# Altium footprint library Miscellaneous C_nn.PcbLib: 416 footprints (part 6 of 26)
Each footprint in its own frame and in the unit in brackets; x right, y up, seen from the top. Pads: shape width x height; smd on the part's side, far side on the other; paste and mask are expansions set on the pad; w line width, h text height; cw(c..) or ccw(c..) is an arc to the next point about the centre after c.
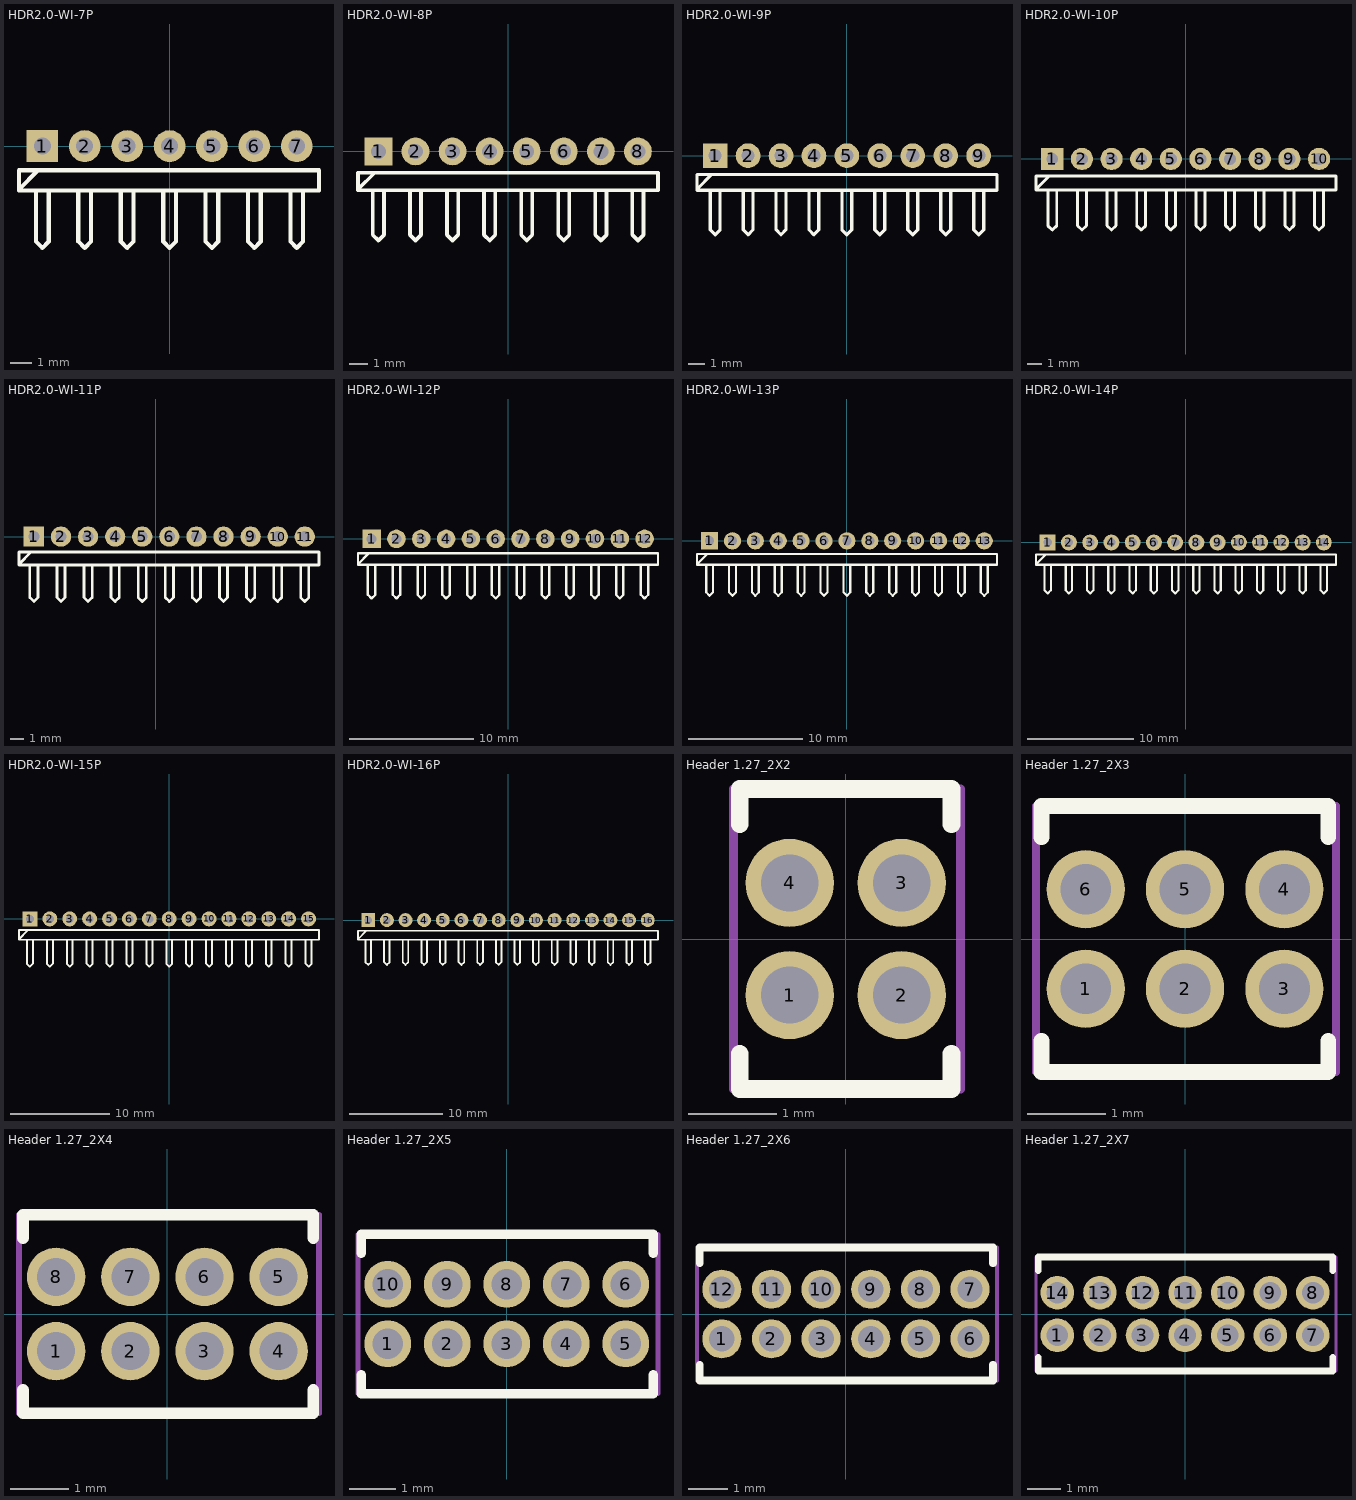
[diagram p5: the footprints below, top view; thin cyan lines are the x and y axes]

## HDR2.0-WI-7P [mm] "卧插，脚距：2.0mm"
pads (7):
  rect 1.5x1.5 hole 0.8: 1(-6,0)
  round 1.5 hole 0.8: 2(-4,0) 3(-2,0) 4(0,0) 5(2,0) 6(4,0) 7(6,0)
Top Overlay:
  lines w0.2: -7.1,-1.8 -7.1,-1.743 ; -6.3,-2.2 -6.3,-4.5 -6,-4.8 -5.7,-4.5 -5.7,-2.1 ; -6.2,-1.143 -7.1,-2.043 -7.1,-2.1 ; -4.3,-2.2 -4.3,-4.5 -4,-4.8 -3.7,-4.5 -3.7,-2.1 ; -2.3,-2.2 -2.3,-4.5 -2,-4.8 -1.7,-4.5 -1.7,-2.1 ; -0.3,-2.2 -0.3,-4.5 0,-4.8 0.3,-4.5 0.3,-2.1 ; 1.7,-2.2 1.7,-4.5 2,-4.8 2.3,-4.5 2.3,-2.1 ; 3.7,-2.2 3.7,-4.5 4,-4.8 4.3,-4.5 4.3,-2.1 ; 5.7,-2.2 5.7,-4.5 6,-4.8 6.3,-4.5 6.3,-2.1 ; -7.1,-2.1 -7.1,-1.143 -5.492,-1.143 7.049,-1.143 7.049,-2.1 -7.1,-2.1
3D body "HDR2.0-WI-7P.STEP": height 3.25, standoff -2.8, extent -7,-5 7,1

## HDR2.0-WI-8P [mm] "卧插，脚距：2.0mm"
pads (8):
  rect 1.5x1.5 hole 0.8: 1(-7,0)
  round 1.5 hole 0.8: 2(-5,0) 3(-3,0) 4(-1,0) 5(1,0) 6(3,0) 7(5,0) 8(7,0)
Top Overlay:
  lines w0.2: -8.1,-1.8 -8.1,-1.743 ; -7.3,-2.2 -7.3,-4.5 -7,-4.8 -6.7,-4.5 -6.7,-2.1 ; -7.2,-1.143 -8.1,-2.043 -8.1,-2.1 ; -5.3,-2.2 -5.3,-4.5 -5,-4.8 -4.7,-4.5 -4.7,-2.1 ; -3.3,-2.2 -3.3,-4.5 -3,-4.8 -2.7,-4.5 -2.7,-2.1 ; -1.3,-2.2 -1.3,-4.5 -1,-4.8 -0.7,-4.5 -0.7,-2.1 ; 0.7,-2.2 0.7,-4.5 1,-4.8 1.3,-4.5 1.3,-2.1 ; 2.7,-2.2 2.7,-4.5 3,-4.8 3.3,-4.5 3.3,-2.1 ; 4.7,-2.2 4.7,-4.5 5,-4.8 5.3,-4.5 5.3,-2.1 ; 6.7,-2.2 6.7,-4.5 7,-4.8 7.3,-4.5 7.3,-2.1 ; -8.1,-2.1 8.081,-2.1 8.081,-1.143 -6.492,-1.143 -8.1,-1.143 -8.1,-2.1
3D body "HDR2.0-WI-8P.STEP": height 3.25, standoff -2.8, extent -8,-5 8,1

## HDR2.0-WI-9P [mm] "卧插，脚距：2.0mm"
pads (9):
  rect 1.5x1.5 hole 0.8: 1(-8,0)
  round 1.5 hole 0.8: 2(-6,0) 3(-4,0) 4(-2,0) 5(0,0) 6(2,0) 7(4,0) 8(6,0) 9(8,0)
Top Overlay:
  lines w0.2: -9.1,-1.8 -9.1,-1.743 ; -8.3,-2.2 -8.3,-4.5 -8,-4.8 -7.7,-4.5 -7.7,-2.1 ; -8.2,-1.143 -9.1,-2.043 -9.1,-2.1 ; -6.3,-2.2 -6.3,-4.5 -6,-4.8 -5.7,-4.5 -5.7,-2.1 ; -4.3,-2.2 -4.3,-4.5 -4,-4.8 -3.7,-4.5 -3.7,-2.1 ; -2.3,-2.2 -2.3,-4.5 -2,-4.8 -1.7,-4.5 -1.7,-2.1 ; -0.3,-2.2 -0.3,-4.5 0,-4.8 0.3,-4.5 0.3,-2.1 ; 1.7,-2.2 1.7,-4.5 2,-4.8 2.3,-4.5 2.3,-2.1 ; 3.7,-2.2 3.7,-4.5 4,-4.8 4.3,-4.5 4.3,-2.1 ; 5.7,-2.2 5.7,-4.5 6,-4.8 6.3,-4.5 6.3,-2.1 ; 7.7,-2.2 7.7,-4.5 8,-4.8 8.3,-4.5 8.3,-2.1 ; -9.1,-2.1 -9.1,-1.143 -7.492,-1.143 9.113,-1.143 9.113,-2.1 -9.1,-2.1
3D body "HDR2.0-WI-9P.STEP": height 3.25, standoff -2.8, extent -9,-5 9,1

## HDR2.0-WI-10P [mm] "卧插，脚距：2.0mm"
pads (10):
  rect 1.5x1.5 hole 0.8: 1(-9,0)
  round 1.5 hole 0.8: 2(-7,0) 3(-5,0) 4(-3,0) 5(-1,0) 6(1,0) 7(3,0) 8(5,0) 9(7,0) 10(9,0)
Top Overlay:
  lines w0.2: -10.1,-1.8 -10.1,-1.743 ; -9.3,-2.2 -9.3,-4.5 -9,-4.8 -8.7,-4.5 -8.7,-2.1 ; -9.2,-1.143 -10.1,-2.043 -10.1,-2.1 ; -7.3,-2.2 -7.3,-4.5 -7,-4.8 -6.7,-4.5 -6.7,-2.1 ; -5.3,-2.2 -5.3,-4.5 -5,-4.8 -4.7,-4.5 -4.7,-2.1 ; -3.3,-2.2 -3.3,-4.5 -3,-4.8 -2.7,-4.5 -2.7,-2.1 ; -1.3,-2.2 -1.3,-4.5 -1,-4.8 -0.7,-4.5 -0.7,-2.1 ; 0.7,-2.2 0.7,-4.5 1,-4.8 1.3,-4.5 1.3,-2.1 ; 2.7,-2.2 2.7,-4.5 3,-4.8 3.3,-4.5 3.3,-2.1 ; 4.7,-2.2 4.7,-4.5 5,-4.8 5.3,-4.5 5.3,-2.1 ; 6.7,-2.2 6.7,-4.5 7,-4.8 7.3,-4.5 7.3,-2.1 ; 8.7,-2.2 8.7,-4.5 9,-4.8 9.3,-4.5 9.3,-2.1 ; -10.1,-2.1 10.145,-2.1 10.145,-1.143 -8.492,-1.143 -10.1,-1.143 -10.1,-2.1
3D body "HDR2.0-WI-10P.STEP": height 3.25, standoff -2.8, extent -10,-5 10,1

## HDR2.0-WI-11P [mm] "卧插，脚距：2.0mm"
pads (11):
  rect 1.5x1.5 hole 0.8: 1(-9,0)
  round 1.5 hole 0.8: 2(-7,0) 3(-5,0) 4(-3,0) 5(-1,0) 6(1,0) 7(3,0) 8(5,0) 9(7,0) 10(9,0) 11(11,0)
Top Overlay:
  lines w0.2: -10.1,-1.8 -10.1,-1.743 ; -9.3,-2.2 -9.3,-4.5 -9,-4.8 -8.7,-4.5 -8.7,-2.1 ; -9.2,-1.143 -10.1,-2.043 -10.1,-2.1 ; -7.3,-2.2 -7.3,-4.5 -7,-4.8 -6.7,-4.5 -6.7,-2.1 ; -5.3,-2.2 -5.3,-4.5 -5,-4.8 -4.7,-4.5 -4.7,-2.1 ; -3.3,-2.2 -3.3,-4.5 -3,-4.8 -2.7,-4.5 -2.7,-2.1 ; -1.3,-2.2 -1.3,-4.5 -1,-4.8 -0.7,-4.5 -0.7,-2.1 ; 0.7,-2.2 0.7,-4.5 1,-4.8 1.3,-4.5 1.3,-2.1 ; 2.7,-2.2 2.7,-4.5 3,-4.8 3.3,-4.5 3.3,-2.1 ; 4.7,-2.2 4.7,-4.5 5,-4.8 5.3,-4.5 5.3,-2.1 ; 6.7,-2.2 6.7,-4.5 7,-4.8 7.3,-4.5 7.3,-2.1 ; 8.7,-2.2 8.7,-4.5 9,-4.8 9.3,-4.5 9.3,-2.1 ; 10.7,-2.2 10.7,-4.5 11,-4.8 11.3,-4.5 11.3,-2.1 ; -10.1,-2.1 12.05,-2.1 12.05,-1.143 -8.492,-1.143 -10.1,-1.143 -10.1,-2.1
3D body "HDR2.0-WI-11P.STEP": height 3.25, standoff -2.8, extent -10,-5 12,1

## HDR2.0-WI-12P [mm] "卧插，脚距：2.0mm"
pads (12):
  rect 1.5x1.5 hole 0.8: 1(-11,0)
  round 1.5 hole 0.8: 2(-9,0) 3(-7,0) 4(-5,0) 5(-3,0) 6(-1,0) 7(1,0) 8(3,0) 9(5,0) 10(7,0) 11(9,0) 12(11,0)
Top Overlay:
  lines w0.2: -12.1,-1.8 -12.1,-1.743 ; -11.3,-2.2 -11.3,-4.5 -11,-4.8 -10.7,-4.5 -10.7,-2.1 ; -11.2,-1.143 -12.1,-2.043 -12.1,-2.1 ; -9.3,-2.2 -9.3,-4.5 -9,-4.8 -8.7,-4.5 -8.7,-2.1 ; -7.3,-2.2 -7.3,-4.5 -7,-4.8 -6.7,-4.5 -6.7,-2.1 ; -5.3,-2.2 -5.3,-4.5 -5,-4.8 -4.7,-4.5 -4.7,-2.1 ; -3.3,-2.2 -3.3,-4.5 -3,-4.8 -2.7,-4.5 -2.7,-2.1 ; -1.3,-2.2 -1.3,-4.5 -1,-4.8 -0.7,-4.5 -0.7,-2.1 ; 0.7,-2.2 0.7,-4.5 1,-4.8 1.3,-4.5 1.3,-2.1 ; 2.7,-2.2 2.7,-4.5 3,-4.8 3.3,-4.5 3.3,-2.1 ; 4.7,-2.2 4.7,-4.5 5,-4.8 5.3,-4.5 5.3,-2.1 ; 6.7,-2.2 6.7,-4.5 7,-4.8 7.3,-4.5 7.3,-2.1 ; 8.7,-2.2 8.7,-4.5 9,-4.8 9.3,-4.5 9.3,-2.1 ; 10.7,-2.2 10.7,-4.5 11,-4.8 11.3,-4.5 11.3,-2.1 ; -12.1,-2.1 -12.1,-1.143 -10.492,-1.143 12.082,-1.143 12.082,-2.1 -12.1,-2.1
3D body "HDR2.0-WI-12P.STEP": height 3.25, standoff -2.8, extent -12,-5 12,1

## HDR2.0-WI-13P [mm] "卧插，脚距：2.0mm"
pads (13):
  rect 1.5x1.5 hole 0.8: 1(-12,0)
  round 1.5 hole 0.8: 2(-10,0) 3(-8,0) 4(-6,0) 5(-4,0) 6(-2,0) 7(0,0) 8(2,0) 9(4,0) 10(6,0) 11(8,0) 12(10,0) 13(12,0)
Top Overlay:
  lines w0.2: -13.1,-1.8 -13.1,-1.743 ; -12.3,-2.2 -12.3,-4.5 -12,-4.8 -11.7,-4.5 -11.7,-2.1 ; -12.2,-1.143 -13.1,-2.043 -13.1,-2.1 ; -10.3,-2.2 -10.3,-4.5 -10,-4.8 -9.7,-4.5 -9.7,-2.1 ; -8.3,-2.2 -8.3,-4.5 -8,-4.8 -7.7,-4.5 -7.7,-2.1 ; -6.3,-2.2 -6.3,-4.5 -6,-4.8 -5.7,-4.5 -5.7,-2.1 ; -4.3,-2.2 -4.3,-4.5 -4,-4.8 -3.7,-4.5 -3.7,-2.1 ; -2.3,-2.2 -2.3,-4.5 -2,-4.8 -1.7,-4.5 -1.7,-2.1 ; -0.3,-2.2 -0.3,-4.5 0,-4.8 0.3,-4.5 0.3,-2.1 ; 1.7,-2.2 1.7,-4.5 2,-4.8 2.3,-4.5 2.3,-2.1 ; 3.7,-2.2 3.7,-4.5 4,-4.8 4.3,-4.5 4.3,-2.1 ; 5.7,-2.2 5.7,-4.5 6,-4.8 6.3,-4.5 6.3,-2.1 ; 7.7,-2.2 7.7,-4.5 8,-4.8 8.3,-4.5 8.3,-2.1 ; 9.7,-2.2 9.7,-4.5 10,-4.8 10.3,-4.5 10.3,-2.1 ; 11.7,-2.2 11.7,-4.5 12,-4.8 12.3,-4.5 12.3,-2.1 ; -13.1,-2.1 -13.1,-1.143 -11.492,-1.143 13.114,-1.143 13.114,-2.1 -13.1,-2.1
3D body "HDR2.0-WI-13P.STEP": height 3.25, standoff -2.8, extent -13,-5 13,1

## HDR2.0-WI-14P [mm] "卧插，脚距：2.0mm"
pads (14):
  rect 1.5x1.5 hole 0.8: 1(-13,0)
  round 1.5 hole 0.8: 2(-11,0) 3(-9,0) 4(-7,0) 5(-5,0) 6(-3,0) 7(-1,0) 8(1,0) 9(3,0) 10(5,0) 11(7,0) 12(9,0) 13(11,0) 14(13,0)
Top Overlay:
  lines w0.2: -14.1,-1.8 -14.1,-1.743 ; -13.3,-2.2 -13.3,-4.5 -13,-4.8 -12.7,-4.5 -12.7,-2.1 ; -13.2,-1.143 -14.1,-2.043 -14.1,-2.1 ; -11.3,-2.2 -11.3,-4.5 -11,-4.8 -10.7,-4.5 -10.7,-2.1 ; -9.3,-2.2 -9.3,-4.5 -9,-4.8 -8.7,-4.5 -8.7,-2.1 ; -7.3,-2.2 -7.3,-4.5 -7,-4.8 -6.7,-4.5 -6.7,-2.1 ; -5.3,-2.2 -5.3,-4.5 -5,-4.8 -4.7,-4.5 -4.7,-2.1 ; -3.3,-2.2 -3.3,-4.5 -3,-4.8 -2.7,-4.5 -2.7,-2.1 ; -1.3,-2.2 -1.3,-4.5 -1,-4.8 -0.7,-4.5 -0.7,-2.1 ; 0.7,-2.2 0.7,-4.5 1,-4.8 1.3,-4.5 1.3,-2.1 ; 2.7,-2.2 2.7,-4.5 3,-4.8 3.3,-4.5 3.3,-2.1 ; 4.7,-2.2 4.7,-4.5 5,-4.8 5.3,-4.5 5.3,-2.1 ; 6.7,-2.2 6.7,-4.5 7,-4.8 7.3,-4.5 7.3,-2.1 ; 8.7,-2.2 8.7,-4.5 9,-4.8 9.3,-4.5 9.3,-2.1 ; 10.7,-2.2 10.7,-4.5 11,-4.8 11.3,-4.5 11.3,-2.1 ; 12.7,-2.2 12.7,-4.5 13,-4.8 13.3,-4.5 13.3,-2.1 ; -14.1,-2.1 14.146,-2.1 14.146,-1.143 -12.492,-1.143 -14.1,-1.143 -14.1,-2.1
3D body "HDR2.0-WI-14P.STEP": height 3.25, standoff -2.8, extent -14,-5 14,1

## HDR2.0-WI-15P [mm] "卧插，脚距：2.0mm"
pads (15):
  rect 1.5x1.5 hole 0.8: 1(-14,0)
  round 1.5 hole 0.8: 2(-12,0) 3(-10,0) 4(-8,0) 5(-6,0) 6(-4,0) 7(-2,0) 8(0,0) 9(2,0) 10(4,0) 11(6,0) 12(8,0) 13(10,0) 14(12,0) 15(14,0)
Top Overlay:
  lines w0.2: -15.1,-1.8 -15.1,-1.743 ; -14.3,-2.2 -14.3,-4.5 -14,-4.8 -13.7,-4.5 -13.7,-2.1 ; -14.2,-1.143 -15.1,-2.043 -15.1,-2.1 ; -12.3,-2.2 -12.3,-4.5 -12,-4.8 -11.7,-4.5 -11.7,-2.1 ; -10.3,-2.2 -10.3,-4.5 -10,-4.8 -9.7,-4.5 -9.7,-2.1 ; -8.3,-2.2 -8.3,-4.5 -8,-4.8 -7.7,-4.5 -7.7,-2.1 ; -6.3,-2.2 -6.3,-4.5 -6,-4.8 -5.7,-4.5 -5.7,-2.1 ; -4.3,-2.2 -4.3,-4.5 -4,-4.8 -3.7,-4.5 -3.7,-2.1 ; -2.3,-2.2 -2.3,-4.5 -2,-4.8 -1.7,-4.5 -1.7,-2.1 ; -0.3,-2.2 -0.3,-4.5 0,-4.8 0.3,-4.5 0.3,-2.1 ; 1.7,-2.2 1.7,-4.5 2,-4.8 2.3,-4.5 2.3,-2.1 ; 3.7,-2.2 3.7,-4.5 4,-4.8 4.3,-4.5 4.3,-2.1 ; 5.7,-2.2 5.7,-4.5 6,-4.8 6.3,-4.5 6.3,-2.1 ; 7.7,-2.2 7.7,-4.5 8,-4.8 8.3,-4.5 8.3,-2.1 ; 9.7,-2.2 9.7,-4.5 10,-4.8 10.3,-4.5 10.3,-2.1 ; 11.7,-2.2 11.7,-4.5 12,-4.8 12.3,-4.5 12.3,-2.1 ; 13.7,-2.2 13.7,-4.5 14,-4.8 14.3,-4.5 14.3,-2.1 ; -15.1,-2.1 -15.1,-1.143 -13.492,-1.143 15.051,-1.143 15.051,-2.1 -15.1,-2.1
3D body "HDR2.0-WI-15P.STEP": height 3.25, standoff -2.8, extent -15,-5 15,1

## HDR2.0-WI-16P [mm] "卧插，脚距：2.0mm"
pads (16):
  rect 1.5x1.5 hole 0.8: 1(-15,0)
  round 1.5 hole 0.8: 2(-13,0) 3(-11,0) 4(-9,0) 5(-7,0) 6(-5,0) 7(-3,0) 8(-1,0) 9(1,0) 10(3,0) 11(5,0) 12(7,0) 13(9,0) 14(11,0) 15(13,0) 16(15,0)
Top Overlay:
  lines w0.2: -16.1,-1.8 -16.1,-1.743 ; -15.3,-2.2 -15.3,-4.5 -15,-4.8 -14.7,-4.5 -14.7,-2.1 ; -15.2,-1.143 -16.1,-2.043 -16.1,-2.1 ; -13.3,-2.2 -13.3,-4.5 -13,-4.8 -12.7,-4.5 -12.7,-2.1 ; -11.3,-2.2 -11.3,-4.5 -11,-4.8 -10.7,-4.5 -10.7,-2.1 ; -9.3,-2.2 -9.3,-4.5 -9,-4.8 -8.7,-4.5 -8.7,-2.1 ; -7.3,-2.2 -7.3,-4.5 -7,-4.8 -6.7,-4.5 -6.7,-2.1 ; -5.3,-2.2 -5.3,-4.5 -5,-4.8 -4.7,-4.5 -4.7,-2.1 ; -3.3,-2.2 -3.3,-4.5 -3,-4.8 -2.7,-4.5 -2.7,-2.1 ; -1.3,-2.2 -1.3,-4.5 -1,-4.8 -0.7,-4.5 -0.7,-2.1 ; 0.7,-2.2 0.7,-4.5 1,-4.8 1.3,-4.5 1.3,-2.1 ; 2.7,-2.2 2.7,-4.5 3,-4.8 3.3,-4.5 3.3,-2.1 ; 4.7,-2.2 4.7,-4.5 5,-4.8 5.3,-4.5 5.3,-2.1 ; 6.7,-2.2 6.7,-4.5 7,-4.8 7.3,-4.5 7.3,-2.1 ; 8.7,-2.2 8.7,-4.5 9,-4.8 9.3,-4.5 9.3,-2.1 ; 10.7,-2.2 10.7,-4.5 11,-4.8 11.3,-4.5 11.3,-2.1 ; 12.7,-2.2 12.7,-4.5 13,-4.8 13.3,-4.5 13.3,-2.1 ; 14.7,-2.2 14.7,-4.5 15,-4.8 15.3,-4.5 15.3,-2.1 ; -16.1,-2.1 16.1,-2.1 16.1,-1.143 -14.492,-1.143 -16.1,-1.143 -16.1,-2.1
3D body "HDR2.0-WI-16P.STEP": height 3.25, standoff -2.8, extent -16,-5 16,1

## Header 1.27_2X2 [mm]
pads (4):
  round 1 hole 0.65: 1(-0.635,-0.635) 2(0.635,-0.635) 3(0.635,0.635) 4(-0.635,0.635)
Top Overlay:
  lines w0.2: -1.2,-1.3 -1.2,-1.7 1.2,-1.7 1.2,-1.3 ; -1.2,1.3 -1.2,1.7 1.2,1.7 1.2,1.3
Mechanical 15:
  lines w0.1: -1.27,-1.7 -1.27,1.7 1.3,1.7 1.3,-1.7 -1.27,-1.7
3D body "HEADER 1.27-2X4.STEP": height 4.7, standoff -2.6, extent -1.27,-1.5 1.27,1.5

## Header 1.27_2X3 [mm]
pads (6):
  round 1 hole 0.65: 1(-1.27,-0.635) 2(0,-0.635) 3(1.27,-0.635) 4(1.27,0.635) 5(0,0.635) 6(-1.27,0.635)
Top Overlay:
  lines w0.2: -1.835,-1.3 -1.835,-1.7 1.83,-1.7 1.83,-1.3 ; -1.835,1.3 -1.835,1.7 1.83,1.7 1.83,1.3
Mechanical 15:
  lines w0.1: -1.905,-1.7 -1.905,1.7 1.93,1.7 1.93,-1.7 -1.905,-1.7
3D body "HEADER 1.27-2X6.STEP": height 4.7, standoff -2.6, extent -1.905,-1.5 1.905,1.5

## Header 1.27_2X4 [mm]
pads (8):
  round 1 hole 0.65: 1(-1.905,-0.635) 2(-0.635,-0.635) 3(0.635,-0.635) 4(1.905,-0.635) 5(1.905,0.635) 6(0.635,0.635) 7(-0.635,0.635) 8(-1.905,0.635)
Top Overlay:
  lines w0.2: -2.47,-1.3 -2.47,-1.7 2.495,-1.7 2.495,-1.3 ; -2.47,1.3 -2.47,1.7 2.495,1.7 2.495,1.3
Mechanical 15:
  lines w0.1: -2.54,-1.7 -2.54,1.7 2.595,1.7 2.595,-1.7 -2.54,-1.7
3D body "HEADER 1.27-2X8.STEP": height 4.7, standoff -2.6, extent -2.54,-1.5 2.54,1.5

## Header 1.27_2X5 [mm]
pads (10):
  round 1 hole 0.65: 1(-2.54,-0.635) 2(-1.27,-0.635) 3(0,-0.635) 4(1.27,-0.635) 5(2.54,-0.635) 6(2.54,0.635) 7(1.27,0.635) 8(0,0.635) 9(-1.27,0.635) 10(-2.54,0.635)
Top Overlay:
  lines w0.2: -3.105,-1.3 -3.105,-1.7 3.13,-1.7 3.13,-1.3 ; -3.105,1.3 -3.105,1.7 3.13,1.7 3.13,1.3
Mechanical 15:
  lines w0.1: -3.175,-1.7 -3.175,1.7 3.23,1.7 3.23,-1.7 -3.175,-1.7
3D body "HEADER 1.27-2X10.STEP": height 4.7, standoff -2.6, extent -3.175,-1.5 3.175,1.5

## Header 1.27_2X6 [mm]
pads (12):
  round 1 hole 0.65: 1(-3.175,-0.635) 2(-1.905,-0.635) 3(-0.635,-0.635) 4(0.635,-0.635) 5(1.905,-0.635) 6(3.175,-0.635) 7(3.175,0.635) 8(1.905,0.635) 9(0.635,0.635) 10(-0.635,0.635) 11(-1.905,0.635) 12(-3.175,0.635)
Top Overlay:
  lines w0.2: -3.74,-1.3 -3.74,-1.7 3.765,-1.7 3.765,-1.3 ; -3.74,1.3 -3.74,1.7 3.765,1.7 3.765,1.3
Mechanical 15:
  lines w0.1: -3.81,-1.7 -3.81,1.7 3.865,1.7 3.865,-1.7 -3.81,-1.7
3D body "HEADER 1.27-2X12.STEP": height 4.7, standoff -2.6, extent -3.81,-1.5 3.81,1.5

## Header 1.27_2X7 [mm]
pads (14):
  round 1 hole 0.65: 1(-3.81,-0.635) 2(-2.54,-0.635) 3(-1.27,-0.635) 4(0,-0.635) 5(1.27,-0.635) 6(2.54,-0.635) 7(3.81,-0.635) 8(3.81,0.635) 9(2.54,0.635) 10(1.27,0.635) 11(0,0.635) 12(-1.27,0.635) 13(-2.54,0.635) 14(-3.81,0.635)
Top Overlay:
  lines w0.2: -4.375,-1.3 -4.375,-1.7 4.4,-1.7 4.4,-1.3 ; -4.375,1.3 -4.375,1.7 4.4,1.7 4.4,1.3
Mechanical 15:
  lines w0.1: -4.445,-1.7 4.5,-1.7 4.5,1.7 -4.445,1.7 -4.445,-1.7
3D body "HEADER 1.27-2X14.STEP": height 4.7, standoff -2.6, extent -4.445,-1.5 4.445,1.5